# Altium footprint library TriggersLib.PcbLib: 262 footprints (part 5 of 17)
Each footprint in its own frame and in the unit in brackets; x right, y up, seen from the top. Pads: shape width x height; smd on the part's side, far side on the other; paste and mask are expansions set on the pad; w line width, h text height; cw(c..) or ccw(c..) is an arc to the next point about the centre after c.
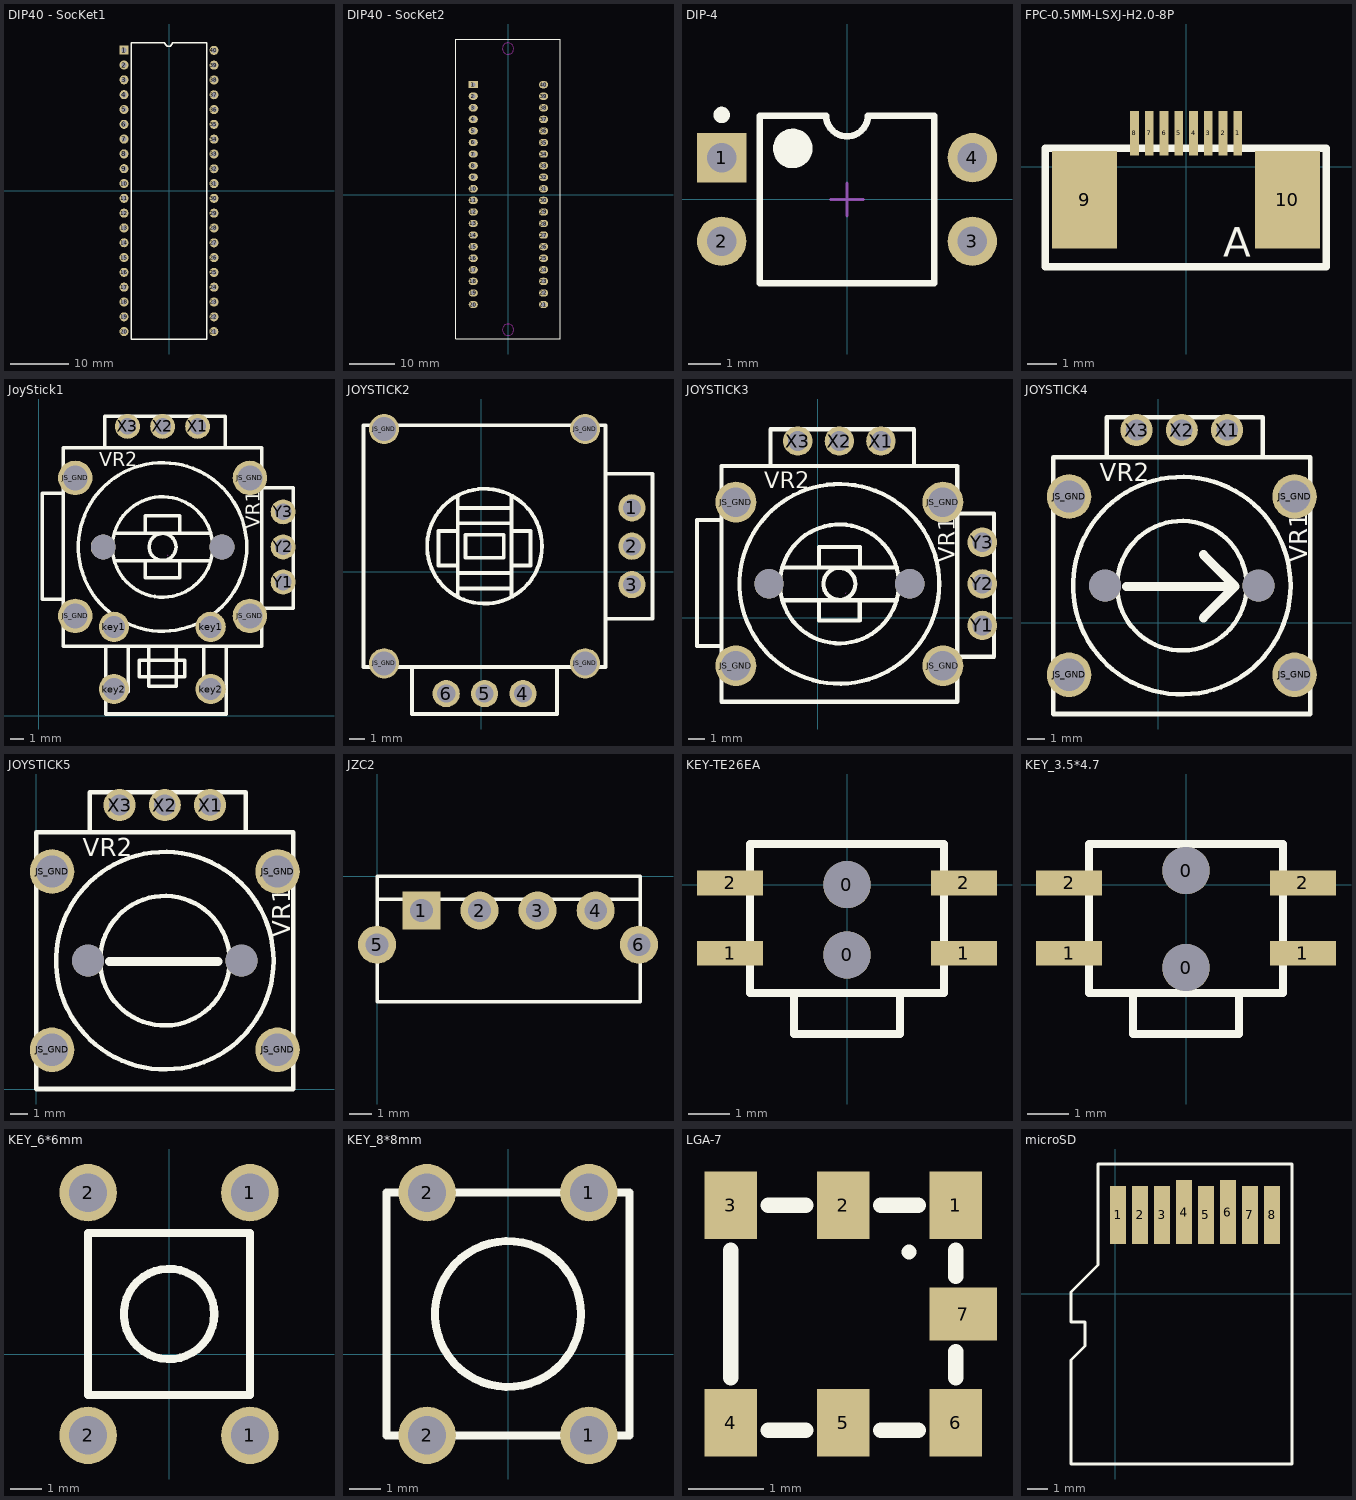
[diagram p4: the footprints below, top view; thin cyan lines are the x and y axes]

## DIP40 - SocKet1 [mil]
pads (40):
  rect 61x61 hole 35: 1(-303.88,950.19)
  round 61 hole 35: 2(-303.62,850.17) 3(-303.62,750.15) 4(-303.62,650.13) 5(-303.62,550.11) 6(-303.62,450.09) 7(-303.62,350.07) 8(-303.62,250.05) 9(-303.62,150.03) 10(-303.62,50.01) 11(-303.62,-50.01) 12(-303.62,-150.03) 13(-303.62,-250.05) 14(-303.62,-350.07) 15(-303.62,-450.09) 16(-303.62,-550.11) 17(-303.62,-650.13) 18(-303.62,-750.15) 19(-303.62,-850.17) 20(-303.62,-950.19) 21(303.04,-950.19) 22(303.88,-850.21) 23(303.88,-750.23) 24(303.88,-650.25) 25(303.88,-550.28) 26(303.88,-450.3) 27(303.88,-350.32) 28(303.88,-250.34) 29(303.88,-150.36) 30(303.88,-50.39) 31(303.88,49.59) 32(303.88,149.57) 33(303.88,249.55) 34(303.88,349.53) 35(303.88,449.5) 36(303.88,549.48) 37(303.88,649.46) 38(303.88,749.44) 39(303.88,849.42) 40(303.88,949.39)
Top Overlay:
  lines w10: -254.04,-1000.19 253.88,-1000.19 253.88,1001.06 21.79,1001.06 cw(c-3.21,1001.06) -28.21,1001.06 -254.04,1001.06 -254.04,-1000.19
3D body "DIP40-600-1.step": height 188.98, standoff -137.8, extent -347.46,-999.03 345.46,997.03

## DIP40 - SocKet2 [mm]
pads (40):
  rect 2x1.6 hole 1: 1(-7.718,24.135)
  oval 2x1.6 hole 1: 2(-7.712,21.594) 3(-7.712,19.054) 4(-7.712,16.513) 5(-7.712,13.973) 6(-7.712,11.432) 7(-7.712,8.892) 8(-7.712,6.351) 9(-7.712,3.811) 10(-7.712,1.27) 11(-7.712,-1.27) 12(-7.712,-3.811) 13(-7.712,-6.351) 14(-7.712,-8.892) 15(-7.712,-11.432) 16(-7.712,-13.973) 17(-7.712,-16.513) 18(-7.712,-19.054) 19(-7.712,-21.594) 20(-7.712,-24.135) 21(7.697,-24.135) 22(7.718,-21.595) 23(7.718,-19.056) 24(7.718,-16.516) 25(7.718,-13.977) 26(7.718,-11.438) 27(7.718,-8.898) 28(7.718,-6.359) 29(7.718,-3.819) 30(7.718,-1.28) 31(7.718,1.26) 32(7.718,3.799) 33(7.718,6.339) 34(7.718,8.878) 35(7.718,11.417) 36(7.718,13.957) 37(7.718,16.496) 38(7.718,19.036) 39(7.718,21.575) 40(7.718,24.115)
Top Overlay:
  lines w0.254: -11.557,-31.699 -11.557,34.137 11.379,34.137 11.379,-31.699 -11.557,-31.699
Keep-Out Layer:
  circle w0.254: c-0.076,-29.667 r1.25
  circle w0.254: c-0.076,32.029 r1.25
3D body "User Library-Zif-Zip Socket.STEP": height 22.37, standoff -2.13, extent -13.076,-31.554 11.399,41.526

## DIP-4 [mm] "光耦（未加焊）"
height 5.6
pads (4):
  rect 1.5x1.5 hole 0.9: 1(-3.81,1.27)
  round 1.5 hole 0.9: 2(-3.81,-1.27) 3(3.81,-1.27) 4(3.81,1.27)
Top Overlay:
  circle w0.25: c-3.81,2.57 r0.125
  circle w0.6: c-1.65,1.55 r0.3
  lines w0.2: -2.65,-2.55 -2.65,2.55 -0.635,2.55 ccw(c0,2.55) 0.635,2.55 2.65,2.55 2.65,-2.55 -2.65,-2.55
Mechanical 15:
  lines w0.1: -0.5,0 0.5,0 ; 0,-0.5 0,0.5
3D body "DIP-4_N.stp": height 4.78, standoff -3, extent -3.915,-2.25 3.925,2.27

## FPC-0.5MM-LSXJ-H2.0-8P [mm]
pads (10):
  rect 0.3x1.5 smd: 1(1.755,1.13) 2(1.255,1.13) 3(0.755,1.13) 4(0.255,1.13) 5(-0.245,1.13) 6(-0.745,1.13) 7(-1.245,1.13) 8(-1.745,1.13)
  rect 2.2x3.3 smd: 9(-3.431,-1.13) 10(3.431,-1.124)
Top Overlay:
  lines w0.254: -4.765,-3.4 -4.765,0.628 ; -4.755,-3.4 4.739,-3.4 ; -4.755,0.628 4.749,0.628 ; 4.757,-3.4 4.757,0.628
  text "A" at 1.27,-3.048 h1

## JoyStick1 [mm]
pads (16):
  round 2.5 hole 1.8: JS_GND(2.629,7.227) JS_GND(2.629,17.227) JS_GND(15.279,7.227) JS_GND(15.279,17.227)
  round 2.2 hole 1.6: key1(5.435,6.435) key1(12.435,6.435) key2(5.435,1.935) key2(12.435,1.935)
  round 1.8 hole 1.2: X1(11.494,20.957) X2(8.954,20.957) X3(6.414,20.957) Y1(17.684,9.687) Y2(17.684,12.227) Y3(17.684,14.767)
  round 1.8 hole 1.8 unplated: ""(4.654,12.227) ""(13.254,12.227)
Top Overlay:
  circle w0.254: c8.954,12.227 r6.1
  circle w0.254: c8.954,12.227 r0.976
  circle w0.254: c8.956,12.225 r3.634
  lines w0.254: 1.754,8.427 0.254,8.427 0.254,16.127 1.754,16.127 ; 4.754,19.427 4.754,21.677 13.504,21.677 13.504,19.427 ; 4.854,0.127 13.554,0.127 13.554,5.027 ; 4.854,0.227 4.854,4.927 ; 4.854,1.727 6.454,1.727 6.454,4.927 6.554,5.027 ; 5.454,11.226 12.454,11.227 ; 5.454,13.227 12.454,13.227 ; 7.701,11.229 7.701,9.979 10.201,9.979 10.201,11.229 ; 7.704,13.227 7.704,14.477 10.204,14.477 10.204,13.227 ; 7.953,5.026 7.953,2.128 9.955,2.128 9.955,5.026 9.853,5.026 ; 11.851,5.028 11.951,4.928 11.951,1.728 13.551,1.728 ; 16.154,7.777 18.404,7.777 18.404,16.527 16.154,16.527 ; 1.754,5.027 1.754,19.427 16.154,19.427 16.154,5.027 1.754,5.027 ; 7.254,2.827 7.254,4.027 10.554,4.027 10.554,2.827 7.254,2.827
  text "VR2" at 4.353,18.081 h1
  text "VR1" at 15.999,13.536 h1
Mechanical 15:
  lines w0.003: 9.33,11.62 9.381,11.671

## JOYSTICK2 [mm]
pads (10):
  round 1.8 hole 1.2: 1(9.956,4.241) 2(9.956,1.701) 3(9.956,-0.839) 4(2.744,-8.051) 5(0.204,-8.051) 6(-2.336,-8.051)
  round 2 hole 1.6 unplated: JS_GND(-6.445,-6.049) JS_GND(-6.445,9.45) JS_GND(6.854,-6.049) JS_GND(6.854,9.45)
Top Overlay:
  circle w0.254: c0.204,1.701 r3.8
  lines w0.254: -7.796,-6.3 -7.796,9.699 ; -7.796,-6.299 8.204,-6.299 ; -7.796,9.701 8.204,9.701 ; -4.596,-6.299 -4.596,-9.4 5.005,-9.4 5.005,-6.299 ; -1.574,-1.601 -1.574,5.003 ; -1.574,-1.093 1.982,-1.093 ; -1.574,-0.077 1.982,-0.077 ; -1.574,0.431 -2.844,0.431 -2.844,2.717 -1.574,2.717 ; -1.574,3.225 1.982,3.225 ; -1.574,4.241 1.982,4.241 ; 1.982,-1.601 1.982,5.003 ; 1.982,0.431 3.252,0.431 3.252,0.685 3.252,2.717 1.982,2.717 ; 8.204,-3.1 11.305,-3.1 11.305,6.501 8.204,6.501 ; 8.205,-6.298 8.205,9.702 ; -1.066,0.939 1.474,0.939 1.474,2.463 -1.066,2.463 -1.066,0.939

## JOYSTICK3 [mm] "摇杆"
pads (12):
  round 2.5 hole 1.8: JS_GND(-4.991,-2.933) JS_GND(-4.991,7.067) JS_GND(7.659,-2.933) JS_GND(7.659,7.067)
  round 1.8 hole 1.2: X1(3.874,10.797) X2(1.334,10.797) X3(-1.206,10.797) Y1(10.064,-0.473) Y2(10.064,2.067) Y3(10.064,4.607)
  round 1.8 hole 1.8 unplated: ""(-2.966,2.067) ""(5.634,2.067)
Top Overlay:
  circle w0.254: c1.334,2.067 r6.1
  circle w0.254: c1.334,2.067 r0.976
  circle w0.254: c1.336,2.065 r3.634
  lines w0.254: -5.866,-1.733 -7.366,-1.733 -7.366,5.967 -5.866,5.967 ; -2.866,9.267 -2.866,11.517 5.884,11.517 5.884,9.267 ; -2.166,1.066 4.834,1.067 ; -2.166,3.067 4.834,3.067 ; 0.081,1.069 0.081,-0.181 2.581,-0.181 2.581,1.069 ; 0.084,3.067 0.084,4.317 2.584,4.317 2.584,3.067 ; 8.534,-2.383 10.784,-2.383 10.784,6.367 8.534,6.367 ; -5.866,-5.133 -5.866,9.267 8.534,9.267 8.534,-5.133 -5.866,-5.133
  text "VR2" at -3.267,7.921 h1
  text "VR1" at 8.379,3.376 h1
Mechanical 15:
  lines w0.003: 1.71,1.46 1.761,1.511

## JOYSTICK4 [mm] "摇杆"
pads (9):
  round 2.5 hole 1.8: JS_GND(-4.991,-2.933) JS_GND(-4.991,7.067) JS_GND(7.659,-2.933) JS_GND(7.659,7.067)
  round 1.8 hole 1.2: X1(3.874,10.797) X2(1.334,10.797) X3(-1.206,10.797)
  round 1.8 hole 1.8 unplated: ""(-2.966,2.067) ""(5.634,2.067)
Top Overlay:
  circle w0.254: c1.336,2.065 r3.634
  circle w0.254: c1.334,2.067 r6.1
  lines w0.254: -2.866,9.267 -2.866,11.517 5.884,11.517 5.884,9.267 ; -5.866,-5.133 8.534,-5.133 8.534,9.267 -5.866,9.267 -5.866,-5.133
  lines w0.508: -1.778,2.032 4.318,2.032 ; 2.54,0.254 4.318,2.032 ; 2.54,3.81 4.318,2.032
  text "VR1" at 8.379,3.376 h1
  text "VR2" at -3.267,7.921 h1

## JOYSTICK5 [mm] "摇杆"
pads (9):
  round 2.5 hole 1.8: JS_GND(0.875,2.2) JS_GND(0.875,12.2) JS_GND(13.525,2.2) JS_GND(13.525,12.2)
  round 1.8 hole 1.2: X1(9.74,15.93) X2(7.2,15.93) X3(4.66,15.93)
  round 1.8 hole 1.8 unplated: ""(2.9,7.2) ""(11.5,7.2)
Top Overlay:
  circle w0.254: c7.202,7.198 r3.634
  circle w0.254: c7.2,7.2 r6.1
  lines w0.254: 3,14.4 3,16.65 11.75,16.65 11.75,14.4 ; 0,0 14.4,0 14.4,14.4 0,14.4 0,0
  lines w0.508: 4.088,7.165 10.184,7.165
  text "VR1" at 14.245,8.509 h1
  text "VR2" at 2.599,13.054 h1

## JZC2 [mil]
pads (6):
  rect 67x67 hole 40: 1(78,-60)
  round 67 hole 40: 2(180,-60) 3(282,-60) 4(384,-60) 5(0,-120) 6(460,-120)
Top Overlay:
  lines w6: 0,-40 462,-40 ; 0,-220 0,0 462,0 462,-220 0,-220

## KEY-TE26EA [mil]
pads (6):
  round 45 hole 45: 0(-0.01,0.39) 0(0.01,-66.61)
  rect 62.99x23.62 smd: 1(-111.5,-64.98) 1(111.5,-64.98) 2(-111.5,2.02) 2(111.5,2.02)
Top Overlay:
  lines w7.87: -50.5,-103.78 -50.5,-141.98 50.5,-141.98 50.5,-103.78 ; -92.5,-102.98 -92.5,39.02 92.5,39.02 92.5,-102.98 -92.5,-102.98
3D body "零": height 63.98, standoff -0.98, extent -115.78,-141.98 116.5,35.18

## KEY_3.5*4.7 [mm]
pads (6):
  round 1.143 hole 1.143: 0(0,-2) 0(0,0.35)
  rect 1.6x0.6 smd: 1(-2.832,-1.651) 1(2.832,-1.651) 2(-2.832,0.051) 2(2.832,0.051)
Top Overlay:
  lines w0.2: -1.283,-2.636 -1.283,-3.606 1.283,-3.606 1.283,-2.636 ; -2.349,-2.616 -2.349,0.991 2.349,0.991 2.349,-2.616 -2.349,-2.616
3D body "零": height 1.63, standoff -0.02, extent -2.941,-3.606 2.959,0.894

## KEY_6*6mm [mm]
pads (4):
  round 1.8 hole 1.2: 1(2.54,-2.54) 1(2.54,5.08) 2(-2.54,-2.54) 2(-2.54,5.08)
Top Overlay:
  circle w0.254: c0,1.27 r1.42
  lines w0.254: -2.54,-1.27 2.54,-1.27 2.54,3.81 -2.54,3.81 -2.54,-1.27

## KEY_8*8mm [mm]
pads (4):
  round 1.8 hole 1.2: 1(2.54,-2.54) 1(2.54,5.08) 2(-2.54,-2.54) 2(-2.54,5.08)
Top Overlay:
  circle w0.254: c0,1.27 r2.29
  lines w0.254: -3.81,-2.54 -3.81,5.08 3.81,5.08 3.81,-2.54 -3.81,-2.54

## LGA-7 [mm] "LGA-7Pin"
pads (7):
  rect 0.7x0.9 smd: 1(-1,5) 2(-2.5,5) 3(-4,5) 4(-4,2.1) 5(-2.5,2.1) 6(-1,2.1)
  rect 0.9x0.7 smd: 7(-0.9,3.55)
Top Overlay:
  lines w0.203: -4,2.7 -4,4.4 ; -3.5,2 -3,2 ; -3.5,5 -3,5 ; -2,2 -1.5,2 ; -2,5 -1.5,5 ; -1,2.7 -1,3.05 ; -1,4.05 -1,4.4 ; -1.625,4.375 -1.625,4.375

## microSD [mm]
pads (8):
  rect 0.8x2.9 smd: 1(0.15,3.95) 2(1.25,3.95) 3(2.35,3.95) 5(4.55,3.95) 7(6.75,3.95) 8(7.85,3.95)
  rect 0.8x3.2 smd: 4(3.45,4.1) 6(5.65,4.1)
Top Overlay:
  lines w0.152: 8.8,-8.5 -2.2,-8.5 -2.2,-3.3 -1.5,-2.6 -1.5,-1.4 -2.2,-1.4 -2.2,0.1 -0.85,1.45 -0.85,6.5 8.85,6.5 8.85,-8.5